# Altium footprint library Dr.Xiong_20160818.PcbLib: 266 footprints (part 3 of 17)
Each footprint in its own frame and in the unit in brackets; x right, y up, seen from the top. Pads: shape width x height; smd on the part's side, far side on the other; paste and mask are expansions set on the pad; w line width, h text height; cw(c..) or ccw(c..) is an arc to the next point about the centre after c.
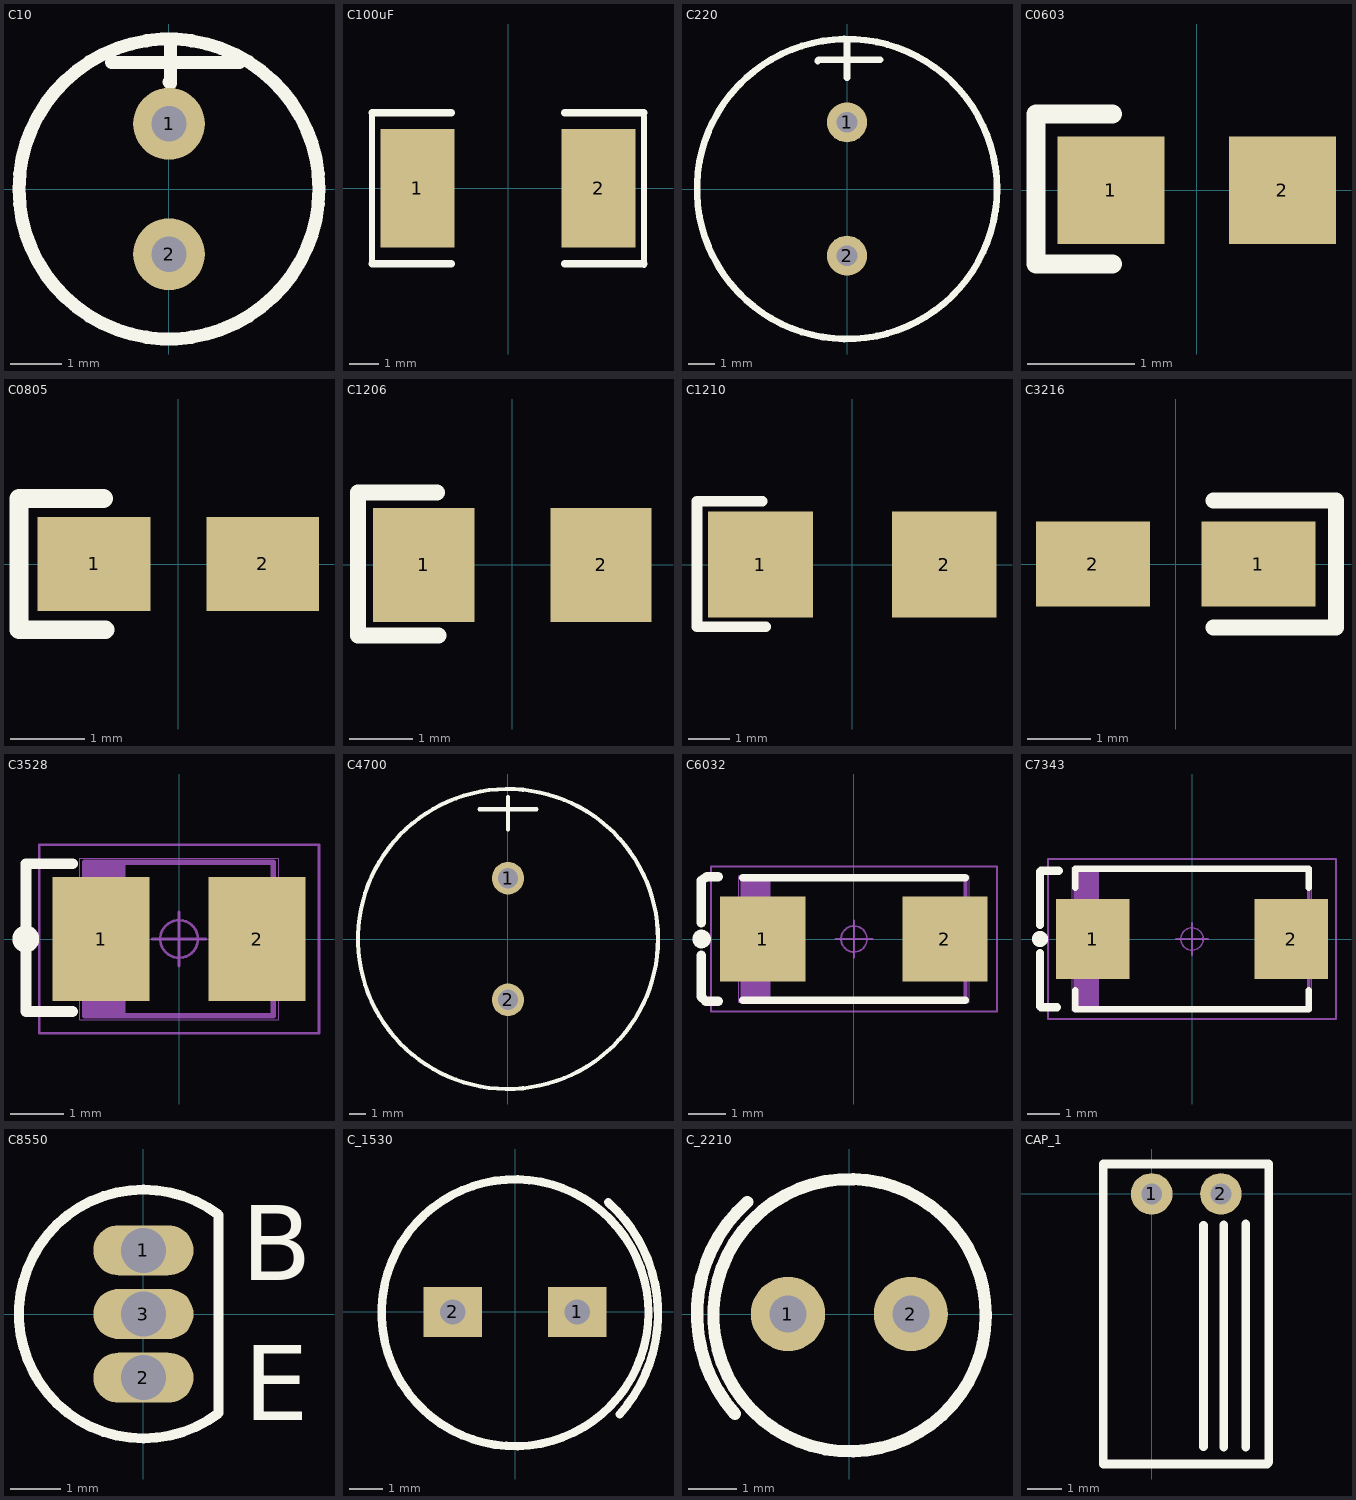
[diagram p2: the footprints below, top view; thin cyan lines are the x and y axes]

## C10 [mil]
pads (2):
  round 55 hole 27: 1(0,50) 2(0,-50)
Top Overlay:
  circle w10: c0,0 r115
  lines w10: -44,97 54,97 ; 0,82 1,81 1,111

## C100uF [mm]
pads (2):
  rect 2.5x4 smd: 1(-3.048,0) 2(3.048,0)
Top Overlay:
  lines w0.2: -4.572,-2.5 -4.572,0 -4.572,2.5 ; 4.572,-2.587 4.572,2.413
  lines w0.254: -4.572,-2.54 -1.905,-2.54 ; -4.572,2.54 -1.905,2.54 ; 1.905,-2.54 4.572,-2.54 ; 1.905,2.54 4.572,2.54

## C220 [mil]
pads (2):
  round 60 hole 31: 1(0,100) 2(0,-100)
Top Overlay:
  circle w10: c0,0 r225
  lines w10: -44,192 -42,194 50,194 ; 0,167 0,219

## C0603 [mm]
pads (2):
  rect 1x1 smd: 1(-0.799,0) 2(0.799,0)
Top Overlay:
  lines w0.178: -1.499,-0.686 -1.499,-0.406 -1.499,0.406 -1.499,0.711 -0.787,0.711 ; -1.473,-0.686 -0.813,-0.686 -0.787,-0.686

## C0805 [mil]
pads (2):
  rect 60x50 smd: 1(-45,0) 2(45,0)
Top Overlay:
  lines w10: -40,35 -85,35 -85,-35 -39,-35

## C1206 [mm]
pads (2):
  rect 1.6x1.8 smd: 1(-1.4,0) 2(1.4,0)
Top Overlay:
  lines w0.254: -1.194,1.143 -2.438,1.143 -2.438,-1.118 -1.168,-1.118

## C1210 [mil]
pads (2):
  rect 99.37x100 smd: 1(-87,0) 2(87.19,0)
Top Overlay:
  lines w10: -85,60 -147,60 -147,-59 -82,-59

## C3216 [mm]
pads (2):
  rect 1.8x1.35 smd: 1(1.31,0) 2(-1.31,0)
Top Overlay:
  lines w0.254: 0.6,-1.002 2.537,-1.002 2.537,1.002 0.6,1.002
3D body "User Library-AVX_ACASE.STEP": height 1.71, standoff 0, extent -1.7,-0.84 1.7,0.84

## C3528 [mm]
pads (2):
  rect 1.8x2.3 smd: 1(-1.45,0) 2(1.45,0)
Top Overlay:
  circle w0.25: c-2.85,0 r0.125
  lines w0.2: -1.981,-1.346 -2.845,-1.346 -2.845,1.397 -1.981,1.397
Mechanical 1:
  lines w0.1: -1.65,-1.425 -1.65,1.425 ; -1.55,-1.425 -1.55,1.425 ; -1.45,-1.425 -1.45,1.425 ; -1.35,-1.425 -1.35,1.425 ; -1.25,-1.425 -1.25,1.425 ; -1.15,-1.425 -1.15,1.425 ; -1.05,-1.425 -1.05,1.425 ; -1.75,-1.425 1.75,-1.425 1.75,1.425 -1.75,1.425 -1.75,-1.425
  text "C1" at -0.087,-0.45 h0.75
Mechanical 16:
  circle w0.05: c0,0 r0.35
  lines w0.001: -1.85,-1.5 1.85,-1.5 1.85,1.5 -1.85,1.5 -1.85,-1.5
  lines w0.05: -0.5,0 0.5,0 ; 0,-0.5 0,0.5 ; -2.6,-1.75 2.6,-1.75 2.6,1.75 -2.6,1.75 -2.6,-1.75

## C4700 [mil]
pads (2):
  round 80 hole 50: 1(0,150) 2(0,-150)
Top Overlay:
  circle w10: c0,0 r370
  lines w10: -70,320 70,320 ; 0,270 0,350

## C6032 [mm]
pads (2):
  rect 2.3x2.3 smd: 1(-2.45,0) 2(2.45,0)
Top Overlay:
  circle w0.25: c-4.1,0 r0.125
  lines w0.102: -4.115,-0.356 -4.115,-1.549 -3.988,-1.676 -3.632,-1.676 ; -4.115,0.406 -4.115,1.575 -4.013,1.676 -3.658,1.676
  lines w0.2: -3,-1.65 3,-1.65 ; -3,1.65 3,1.65
  lines w0.254: -4.115,-0.432 -4.115,-1.549 -3.988,-1.676 -3.658,-1.676 ; -4.115,0.432 -4.115,1.575 -3.962,1.676 -3.658,1.676
Mechanical 1:
  lines w0.1: -2.9,-1.625 -2.9,1.625 ; -2.8,-1.625 -2.8,1.625 ; -2.7,-1.625 -2.7,1.625 ; -2.6,-1.625 -2.6,1.625 ; -2.5,-1.625 -2.5,1.625 ; -2.4,-1.625 -2.4,1.625 ; -2.3,-1.625 -2.3,1.625 ; -3,-1.625 -3,1.625 3,1.625 3,-1.625 -3,-1.625
  text "C1" at -0.537,-0.45 h0.75
Mechanical 16:
  circle w0.05: c0,0 r0.35
  lines w0.001: -3.1,-1.7 -3.1,1.7 3.1,1.7 3.1,-1.7 -3.1,-1.7
  lines w0.05: -0.5,0 0.5,0 ; 0,-0.5 0,0.5 ; -3.85,-1.95 -3.85,1.95 3.85,1.95 3.85,-1.95 -3.85,-1.95

## C7343 [mm]
pads (2):
  rect 2.3x2.5 smd: 1(-3.1,0) 2(3.1,0)
Top Overlay:
  circle w0.25: c-4.75,0 r0.125
  lines w0.102: -4.75,-2.108 -4.75,-0.356 ; -4.75,0.356 -4.75,2.108 -4.724,2.134 -4.216,2.134 ; -4.724,-2.134 -4.267,-2.134
  lines w0.2: -3.65,-1.6 -3.65,-2.2 3.65,-2.2 3.65,-1.6 ; -3.65,1.6 -3.65,2.2 3.65,2.2 3.65,1.6
  lines w0.254: -4.75,-0.432 -4.75,-2.108 -4.724,-2.134 -4.216,-2.134 ; -4.75,0.432 -4.75,2.108 -4.724,2.134 -4.166,2.134
Mechanical 1:
  lines w0.1: -3.55,-2.175 -3.55,2.175 ; -3.45,-2.175 -3.45,2.175 ; -3.35,-2.175 -3.35,2.175 ; -3.25,-2.175 -3.25,2.175 ; -3.15,-2.175 -3.15,2.175 ; -3.05,-2.175 -3.05,2.175 ; -2.95,-2.175 -2.95,2.175 ; -3.65,-2.175 -3.65,2.175 3.65,2.175 3.65,-2.175 -3.65,-2.175
  text "C1" at -0.537,-0.45 h0.75
Mechanical 16:
  circle w0.05: c0,0 r0.35
  lines w0.001: -3.75,-2.25 -3.75,2.25 3.75,2.25 3.75,-2.25 -3.75,-2.25
  lines w0.05: -0.5,0 0.5,0 ; 0,-0.5 0,0.5 ; -4.5,-2.5 -4.5,2.5 4.5,2.5 4.5,-2.5 -4.5,-2.5

## C8550 [mm]
pads (3):
  oval 2x1 hole 0.9: 1(0,1.27) 2(0,-1.27) 3(0,0)
Top Overlay:
  lines w0.2: 1.5,-1.98 cw(c0,0) 1.5,1.98 1.5,-1.98
  text "E" at 2.005,-2.122 h1.5
  text "B" at 1.955,0.678 h1.5

## C_1530 [mil]
pads (2):
  rect 70x60 hole 30: 1(74.31,0) 2(-74.31,0)
Top Overlay:
  circle w10: c0,-0.98 r159.36
  lines w10: 111.22,130.91 cw(c-8.37,-2.46) 125,-122.05

## C_2210 [mil]
pads (2):
  round 60 hole 30: 1(-49.7,0) 2(49.7,0)
Top Overlay:
  circle w10: c0.11,-0.98 r110.13
  lines w10: -92.52,-80.71 cw(c-1.97,0) -82.68,90.55

## CAP_1 [mm]
pads (2):
  round 1.2 hole 0.6: 1(0,0) 2(2,0)
Top Overlay:
  lines w0.254: 1.499,-7.29 1.499,-0.914 ; 2.083,-7.315 2.083,-0.889 ; 2.718,-7.315 2.718,-0.864 ; -1.397,-7.798 3.327,-7.798 3.378,-7.747 3.378,0.864 -1.397,0.864 -1.397,-7.798